# Altium footprint library Hare_Library.PcbLib: 252 footprints (part 8 of 16)
Each footprint in its own frame and in the unit in brackets; x right, y up, seen from the top. Pads: shape width x height; smd on the part's side, far side on the other; paste and mask are expansions set on the pad; w line width, h text height; cw(c..) or ccw(c..) is an arc to the next point about the centre after c.
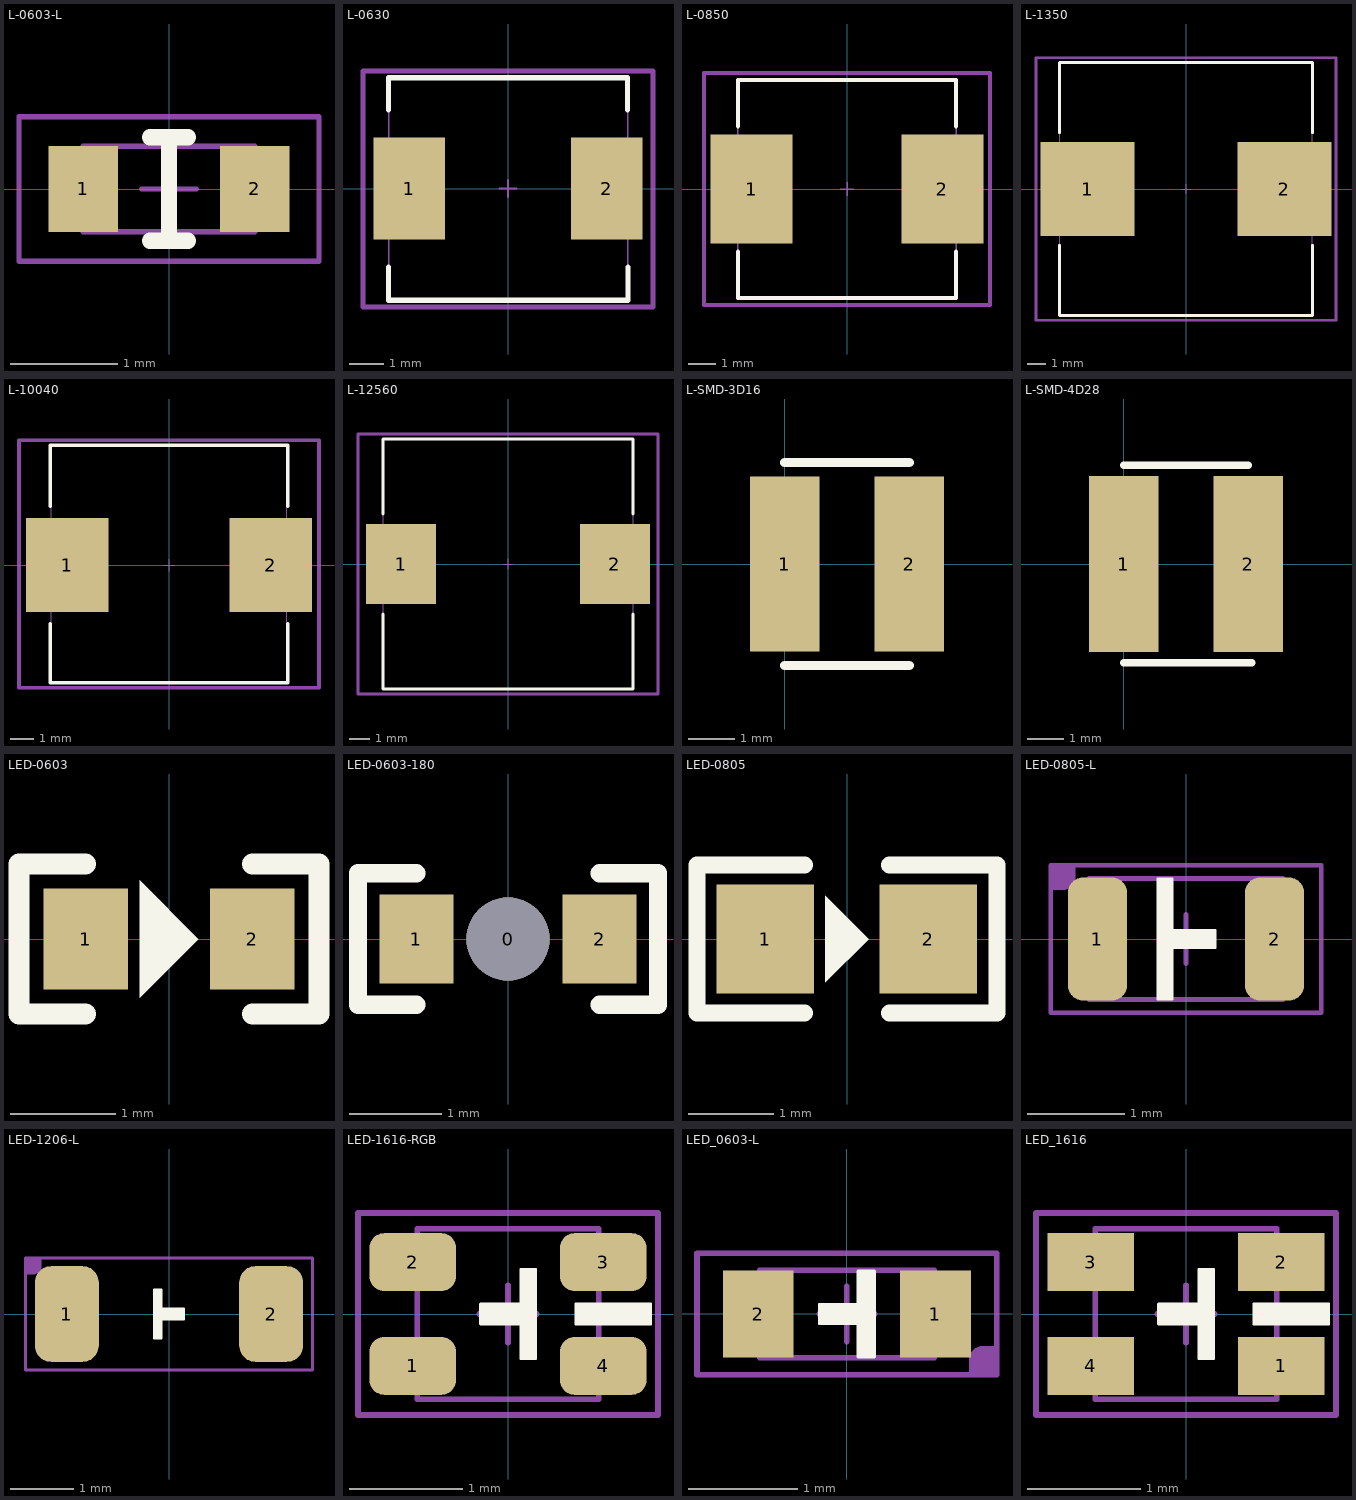
[diagram p7: the footprints below, top view; thin cyan lines are the x and y axes]

## L-0603-L [mm]
height 0.35
pads (2):
  rect 0.65x0.8 smd: 1(-0.8,0) 2(0.8,0)
Top Overlay:
  lines w0.152: -0.178,-0.483 0.178,-0.483 ; -0.178,0.483 0.178,0.483 ; 0,-0.483 0,0.483
Mechanical 13:
  lines w0.051: -0.254,0 0.254,0 ; 0,-0.254 0,0.254 ; -0.8,-0.4 -0.8,0.4 0.8,0.4 0.8,-0.4 -0.8,-0.4
Mechanical 14:
  lines w0.051: -1.4,-0.675 -1.4,0.675 1.4,0.675 1.4,-0.675 -1.4,-0.675
3D body "RESC1608X05L.step": height 0.45, standoff 0, extent -0.8,-0.4 0.8,0.4

## L-0630 [mm] "7*6.6*2.8MM(长*宽*高)"
pads (2):
  rect 2.1x3 smd: 1(-2.9,0) 2(2.9,0)
Top Overlay:
  lines w0.15: -3.5,-2.3 -3.5,-3.275 3.525,-3.275 3.525,-2.3 ; -3.5,2.3 -3.5,3.25 3.5,3.25 3.5,2.3
Mechanical 13:
  lines w0.051: -0.254,0 0.254,0 ; 0,-0.254 0,0.254 ; -3.5,-3.25 3.512,-3.25 3.512,3.238 3.5,3.25 -3.5,3.25 -3.5,-3.25
Mechanical 14:
  lines w0.15: -4.25,-3.475 4.25,-3.475 4.25,3.45 -4.25,3.45 -4.25,-3.475
3D body: height 2.8, standoff 0, extent -3.5,-3.25 3.525,3.25

## L-0850 [mm] "7.8*7.5*5.0MM(长*宽*高)"
pads (2):
  rect 3x4 smd: 1(-3.5,0) 2(3.5,0)
Top Overlay:
  lines w0.15: -4,-2.3 -4,-4 4,-4 4,-2.3 ; -4,2.3 -4,4 4,4 4,2.3
Mechanical 13:
  lines w0.051: -0.254,0 0.254,0 ; 0,-0.254 0,0.254 ; -4,-4 4,-4 4,4 -4,4 -4,-4
Mechanical 14:
  lines w0.15: -5.25,-4.25 -5.25,4.25 5.25,4.25 5.25,-4.25 -5.25,-4.25
3D body: height 3, standoff 0, extent -4,-4 4,4

## L-1350 [mm] "13.45*12.6*5.0MM(长*宽*高)"
pads (2):
  rect 5x5 smd: 1(-5.25,0) 2(5.25,0)
Top Overlay:
  lines w0.15: -6.75,-3 -6.75,-6.75 6.75,-6.75 6.75,-3 ; -6.75,3 -6.75,6.75 6.75,6.75 6.75,3
Mechanical 13:
  lines w0.051: -0.254,0 0.254,0 ; 0,-0.254 0,0.254 ; -6.725,-6.725 6.725,-6.725 6.725,6.725 -6.725,6.725 -6.725,-6.725
Mechanical 14:
  lines w0.15: -8,-7 8,-7 8,7 -8,7 -8,-7
3D body: height 5, standoff 0, extent -6.75,-6.725 6.725,6.725

## L-10040 [mm] "10.1*11.6*4.0MM(长*宽*高)"
pads (2):
  rect 3.5x4 smd: 1(-4.326,0) 2(4.326,0)
Top Overlay:
  lines w0.15: -5.051,-2.5 -5.051,-5 5.049,-5 5.049,-2.5 ; -5.051,2.5 -5.051,5.1 5.049,5.1 5.049,2.5
Mechanical 13:
  lines w0.051: -0.254,0 0.254,0 ; 0,-0.254 0,0.254 ; -5,-5 -5,5.075 5,5.075 5,-5 -5,-5
Mechanical 14:
  lines w0.15: -6.375,-5.2 -6.375,5.3 6.375,5.3 6.375,-5.2 -6.375,-5.2
3D body: height 4, standoff 0, extent -5,-5 5,5.075

## L-12560 [mm] "12.5*12.8*6.0MM(长*宽*高)"
pads (2):
  rect 3.5x4 smd: 1(-5.35,0) 2(5.35,0)
Top Overlay:
  lines w0.15: -6.25,-2.5 -6.25,-6.25 6.25,-6.25 6.25,-2.5 ; -6.25,2.5 -6.25,6.25 6.25,6.25 6.25,2.5
Mechanical 13:
  lines w0.051: -0.254,0 0.254,0 ; 0,-0.254 0,0.254 ; -6.25,-6.25 -6.25,6.25 6.25,6.25 6.25,-6.25 -6.25,-6.25
Mechanical 14:
  lines w0.15: -7.5,-6.5 -7.5,6.5 7.5,6.5 7.5,-6.5 -7.5,-6.5
3D body: height 6, standoff 0, extent -6.25,-6.25 6.25,6.25

## L-SMD-3D16 [mm] "贴片电感4x4"
pads (2):
  rect 1.5x3.8 smd: 1(0,0) 2(2.7,0)
Top Overlay:
  lines w0.2: 0,-2.2 2.7,-2.2 ; 0,2.2 2.7,2.2
3D body: height 2, standoff 0, extent -0.5,-1.85 3.2,1.85

## L-SMD-4D28 [mm] "贴片电感5x5"
pads (2):
  rect 1.9x4.8 smd: 1(0,0) 2(3.4,0)
Top Overlay:
  lines w0.2: 0,-2.7 3.5,-2.7 ; 0,2.7 3.4,2.7
3D body "CDRH4D28.STEP": height 2.91, standoff 0, extent -0.75,-2.45 4.15,2.45

## LED-0603 [mm]
pads (2):
  rect 0.8x0.96 smd: 1(-0.79,0) 2(0.79,0)
Top Overlay:
  region: -0.279,0.559 -0.279,-0.559 0.279,0
  lines w0.2: -0.79,-0.711 -1.422,-0.711 -1.422,0.711 -0.79,0.711 ; 0.79,-0.711 1.422,-0.711 1.422,0.711 0.79,0.711
3D body "User Library-led_0603LED0603 red.SLDPRT": height 0.6, standoff 0, extent -0.81,-0.4 0.81,0.4

## LED-0603-180 [mm]
pads (3):
  round 0.9 hole 0.9: 0(0,0)
  rect 0.8x0.96 smd: 1(-0.99,0) 2(0.99,0)
Top Overlay:
  lines w0.2: -0.99,-0.711 -1.622,-0.711 -1.622,0.711 -0.99,0.711 ; 0.99,-0.711 1.622,-0.711 1.622,0.711 0.99,0.711
3D body "User Library-led_0603LED0603 red.SLDPRT": height 0.3, standoff -0.3, extent -0.81,-0.4 0.81,0.4

## LED-0805 [mm] "贴片0805发光二极管"
pads (2):
  rect 1.14x1.27 smd: 1(-0.953,0) 2(0.952,0)
Top Overlay:
  region: -0.254,0.508 -0.254,-0.508 0.254,0
  lines w0.2: -0.495,-0.864 -1.753,-0.864 -1.753,0.864 -0.495,0.864 ; 0.495,-0.864 1.753,-0.864 1.753,0.864 0.495,0.864
3D body "LED_0805(R).STEP": height 1, standoff -0.01, extent -1.016,-0.62 1.016,0.65

## LED-0805-L [mil]
height 47.24
pads (2):
  rrect50% 24x50 smd: 1(-36,0) 2(36,0)
Top Overlay:
  region: -11.5,24.5 -5.5,24.5 -5.5,3.5 12,3.5 12,-3.5 -5.5,-3.5 -5.5,-24.5 -11.5,-24.5
  lines w1: -11.5,-24.5 -11.5,24.5 -5.5,24.5 -5.5,3.5 12,3.5 12,-3.5 -5.5,-3.5 -5.5,-24.5 -11.5,-24.5
Mechanical 13:
  lines w2: -10,0 10,0 ; 0,-10 0,10 ; -39.37,-24.61 39.37,-24.61 39.37,24.61 -39.37,24.61 -39.37,-24.61
Mechanical 14:
  region: -55,30 -45,30 -45,25 -45,24.01 -45.76,22.17 -47.17,20.76 -49.01,20 -50,20 -55,20
  lines w2: -55,-30 -55,30 55,30 55,-30 -55,-30
3D body "User Library-led_0805LED0805_red.STEP": height 43.31, standoff 0, extent -39.76,-24.6 39.77,24.61

## LED-1206-L [mil]
height 47.24
pads (2):
  rrect50% 40x60 smd: 1(-64,0) 2(64,0)
Top Overlay:
  region: -9.5,15.5 -4.5,15.5 -4.5,3.5 9.5,3.5 9.5,-3.5 -4.5,-3.5 -4.5,-15.5 -9.5,-15.5
  lines w1: -9.5,-15.5 -9.5,15.5 -4.5,15.5 -4.5,3.5 9.5,3.5 9.5,-3.5 -4.5,-3.5 -4.5,-15.5 -9.5,-15.5
Mechanical 14:
  region: -90,35 -80,35 -80,30 -80,29.01 -80.76,27.17 -82.17,25.76 -84.01,25 -85,25 -90,25
  lines w2: -90,-35 90,-35 90,35 -90,35 -90,-35
3D body "User Library-led_1206LED1206 blue.STEP": height 43.31, standoff 0, extent -63.39,-31.5 63.38,31.5

## LED-1616-RGB [mil]
height 47.24
pads (4):
  rrect50% 30x20 smd: 1(-33,-18) 2(-33,18) 3(33,18) 4(33,-18)
Top Overlay:
  region: 9.5,-15.5 4.5,-15.5 4.5,-3.5 -9.5,-3.5 -9.5,3.5 4.5,3.5 4.5,15.5 9.5,15.5
  region: 49.5,3.5 23.5,3.5 23.5,-3.5 49.5,-3.5
  lines w1: -9.5,-3.5 -9.5,3.5 4.5,3.5 4.5,15.5 9.5,15.5 9.5,-15.5 4.5,-15.5 4.5,-3.5 -9.5,-3.5 ; 23.5,-3.5 49.5,-3.5 49.5,3.5 23.5,3.5 23.5,-3.5
Mechanical 13:
  lines w2: -10,0 10,0 ; 0,-10 0,10 ; -31.49,-29.52 -31.49,29.53 31.5,29.53 31.5,-29.52 -31.49,-29.52
Mechanical 14:
  lines w2: -52,-35 52,-35 52,35 -52,35 -52,-35
3D body "User Library-HSMF-C114.STEP": height 13.39, standoff -0.39, extent -31.49,-29.52 31.5,29.53

## LED_0603-L [mm]
height 0.8
pads (2):
  rect 0.65x0.8 smd: 1(0.813,0) 2(-0.813,0)
Top Overlay:
  region: 0.254,-0.394 0.102,-0.394 0.102,-0.089 -0.254,-0.089 -0.254,0.089 0.102,0.089 0.102,0.394 0.254,0.394
  lines w0.025: -0.254,-0.089 0.102,-0.089 0.102,-0.394 0.254,-0.394 0.254,0.394 0.102,0.394 0.102,0.089 -0.254,0.089 -0.254,-0.089
Mechanical 13:
  lines w0.051: -0.254,0 0.254,0 ; 0,-0.254 0,0.254 ; -0.8,-0.4 0.8,-0.4 0.8,0.4 -0.8,0.4 -0.8,-0.4
Mechanical 14:
  region: 1.377,-0.55 1.123,-0.55 1.123,-0.423 1.123,-0.398 1.142,-0.351 1.178,-0.315 1.225,-0.296 1.25,-0.296 1.377,-0.296
  lines w0.051: -1.375,-0.559 -1.375,0.559 1.375,0.559 1.375,-0.559 -1.375,-0.559
3D body "User Library-led_0603LED0603 red.STEP": height 0.6, standoff 0, extent -0.81,-0.4 0.81,0.4

## LED_1616 [mil]
height 47.24
pads (4):
  rect 30x20 smd: 1(33,-18) 2(33,18) 3(-33,18) 4(-33,-18)
Top Overlay:
  region: 49.5,3.5 23.5,3.5 23.5,-3.5 49.5,-3.5
  region: 9.5,-15.5 4.5,-15.5 4.5,-3.5 -9.5,-3.5 -9.5,3.5 4.5,3.5 4.5,15.5 9.5,15.5
  lines w1: -9.5,-3.5 4.5,-3.5 4.5,-15.5 9.5,-15.5 9.5,15.5 4.5,15.5 4.5,3.5 -9.5,3.5 -9.5,-3.5 ; 23.5,-3.5 23.5,3.5 49.5,3.5 49.5,-3.5 23.5,-3.5
Mechanical 13:
  lines w2: -10,0 10,0 ; 0,-10 0,10 ; -31.49,-29.52 31.5,-29.52 31.5,29.53 -31.49,29.53 -31.49,-29.52
Mechanical 14:
  lines w2: -52,-35 -52,35 52,35 52,-35 -52,-35
3D body "User Library-HSMF-C114.STEP": height 13.39, standoff -0.39, extent -31.49,-29.52 31.5,29.53